# Altium footprint library PcbLib.PcbLib: 428 footprints (part 9 of 27)
Each footprint in its own frame and in the unit in brackets; x right, y up, seen from the top. Pads: shape width x height; smd on the part's side, far side on the other; paste and mask are expansions set on the pad; w line width, h text height; cw(c..) or ccw(c..) is an arc to the next point about the centre after c.
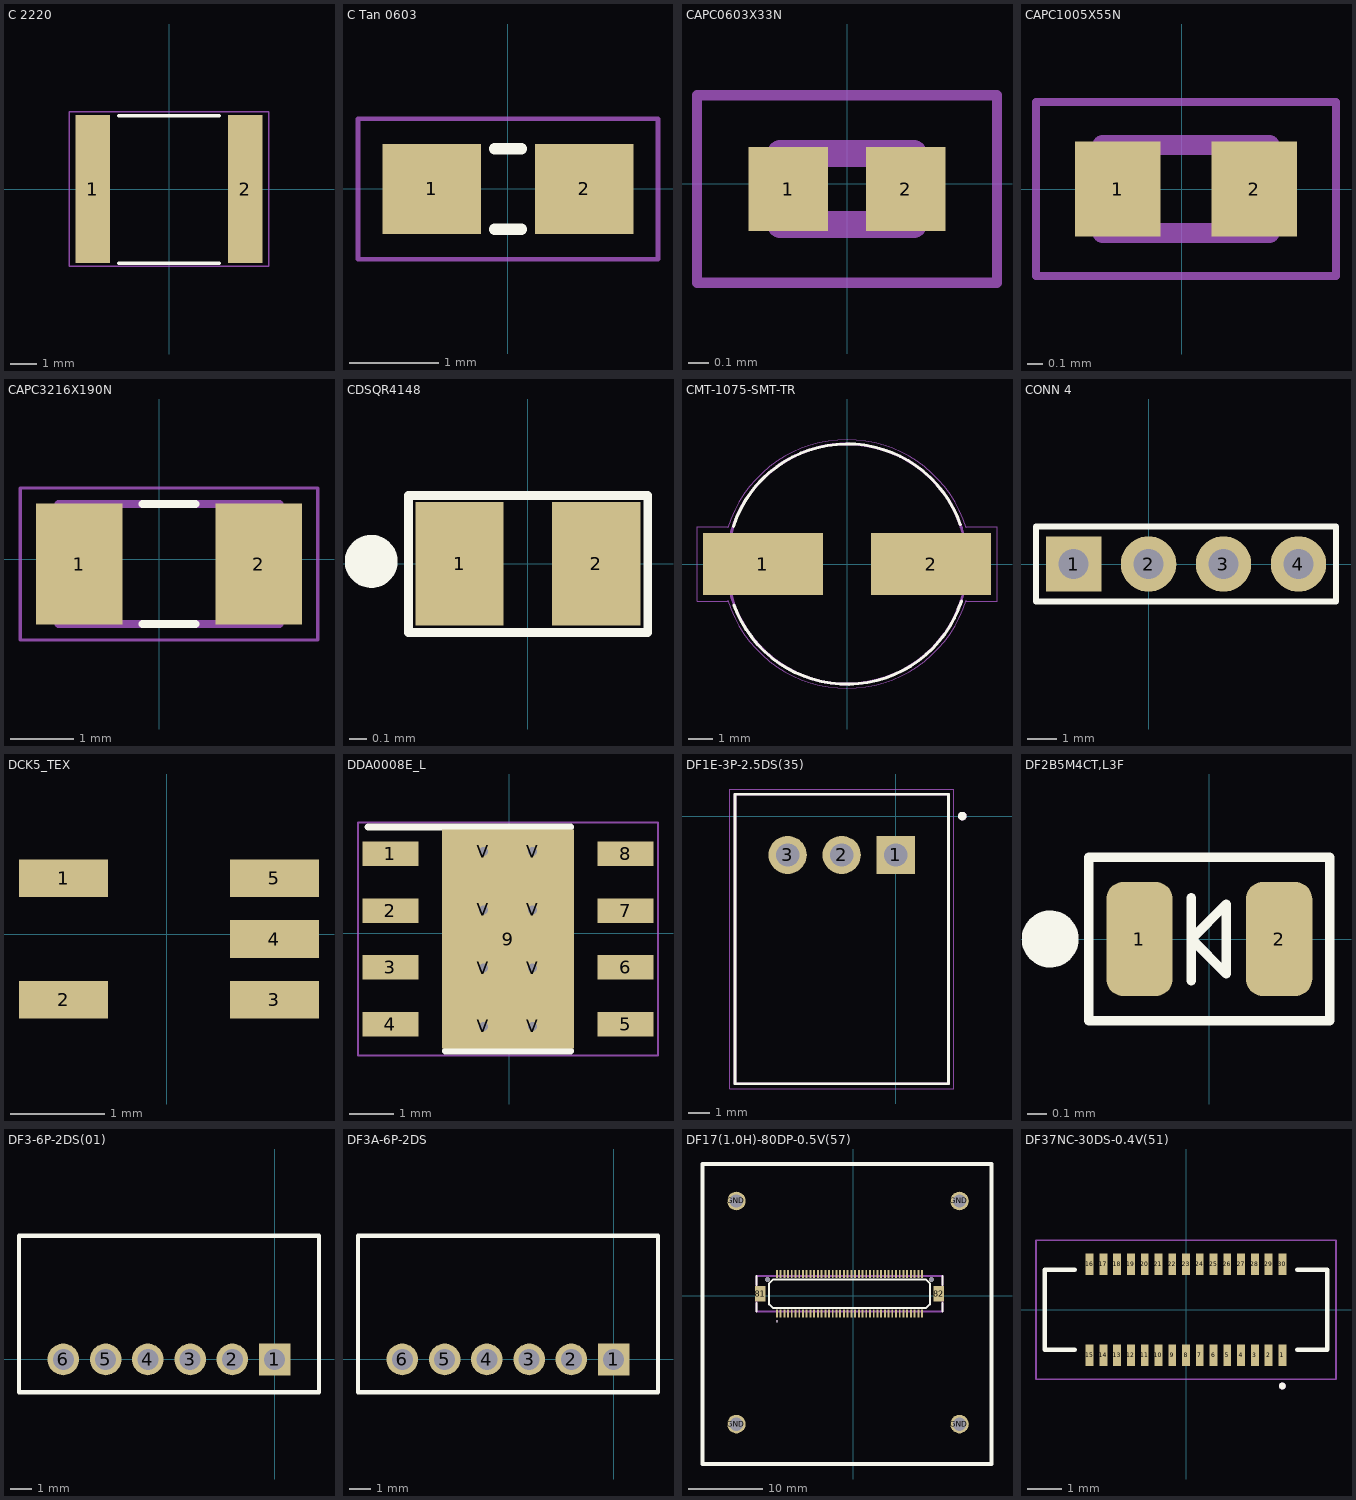
[diagram p8: the footprints below, top view; thin cyan lines are the x and y axes]

## C 2220 [mm]
height 3.1
pads (2):
  rect 1.3x5.588 smd: 1(-2.875,0) 2(2.875,0)
Top Overlay:
  lines w0.127: -1.905,-2.805 1.905,-2.805 ; -1.899,2.767 1.911,2.767
Mechanical 15:
  lines w0.05: -3.775,-2.921 3.775,-2.921 3.775,2.921 -3.775,2.921 -3.775,-2.921
3D body "CAP_C5750X7S2A226M280KB_TDK.step": height 3.1, standoff 0, extent -3.021,-2.718 3.075,2.692

## C Tan 0603 [mm]
pads (2):
  rect 1.1x1 smd: 1(-0.85,0) 2(0.85,0)
Top Overlay:
  lines w0.127: -0.15,-0.45 0.15,-0.45 ; -0.15,0.45 0.15,0.45
Mechanical 15:
  lines w0.051: -1.673,-0.783 -1.673,0.783 1.673,0.783 1.673,-0.783 -1.673,-0.783
3D body "step_temp.STEP": height 1, standoff 0, extent -0.8,-0.425 0.8,0.425

## CAPC0603X33N [mm]
pads (2):
  rect 0.38x0.4 smd paste+0 mask+0.102: 1(-0.281,-0.025) 2(0.281,-0.025)
Mechanical 13:
  lines w0.127: -0.32,-0.195 0.32,-0.195 0.32,0.145 -0.32,0.145 -0.32,-0.195
Mechanical 15:
  lines w0.05: -0.718,-0.473 0.718,-0.473 0.718,0.423 -0.718,0.423 -0.718,-0.473
3D body "step_temp.STEP": height 0.33, standoff 0, extent -0.3,-0.175 0.3,0.125

## CAPC1005X55N [mm]
pads (2):
  rect 0.54x0.6 smd: 1(-0.407,0) 2(0.457,0)
Mechanical 13:
  lines w0.127: -0.505,-0.28 0.555,-0.28 0.555,0.28 -0.505,0.28 -0.505,-0.28
Mechanical 15:
  lines w0.05: -0.925,-0.55 0.975,-0.55 0.975,0.55 -0.925,0.55 -0.925,-0.55
3D body "step_temp.STEP": height 0.55, standoff 0, extent -0.475,-0.25 0.525,0.25

## CAPC3216X190N [mm]
pads (2):
  rect 1.37x1.91 smd: 1(-1.269,-0.076) 2(1.573,-0.076)
Top Overlay:
  lines w0.127: -0.268,-1.026 0.572,-1.026 ; -0.268,0.874 0.572,0.874
Mechanical 13:
  lines w0.127: -1.598,-1.026 -1.598,0.874 1.902,0.874 1.902,-1.026 -1.598,-1.026
Mechanical 15:
  lines w0.05: -2.203,-1.281 -2.203,1.129 2.507,1.129 2.507,-1.281 -2.203,-1.281

## CDSQR4148 [mm]
pads (2):
  rect 0.5x0.7 smd: 1(-0.388,0) 2(0.388,0)
Top Overlay:
  circle w0.15: c-0.889,0.013 r0.075
  lines w0.05: -0.678,-0.39 0.68,-0.39 0.68,0.386 -0.678,0.386 -0.678,-0.39
3D body "step_temp.STEP": height 0.45, standoff 0, extent -0.5,-0.3 0.5,0.3

## CMT-1075-SMT-TR [mm]
pads (2):
  rect 5x2.6 smd: 1(-3.5,0) 2(3.5,0)
Top Overlay:
  lines w0.127: -4.737,1.561 cw(c0.005,0.02) 4.719,1.643 ; -4.706,-1.714 ccw(c0.002,0) 4.767,-1.548
Mechanical 13:
  circle w0.127: c0,0 r5
Mechanical 15:
  lines w0.05: -4.963,-1.507 ccw(c0,0.011) 4.963,-1.507 ; -4.963,1.507 cw(c0,-0.011) 4.963,1.507 ; -4.95,-1.55 -6.25,-1.55 -6.25,1.55 -4.95,1.55 ; 4.95,-1.55 6.25,-1.55 6.25,1.55 4.95,1.55
3D body "step_temp.STEP": height 3, standoff -0.1, extent -5.5,-5 5.5,5

## CONN 4 [mil]
pads (4):
  rect 74x74 hole 40: 1(-100,0)
  round 74 hole 40: 2(0,0) 3(100,0) 4(200,0)
Top Overlay:
  lines w8: -150,-50 -150,50 250,50 250,-50 -150,-50
Mechanical 13:
  region: 210,-10 190,-10 190,10 210,10
  region: 110,-10 90,-10 90,10 110,10
  region: 10,-10 -10,-10 -10,10 10,10
  region: -90,-10 -110,-10 -110,10 -90,10

## DCK5_TEX [mm]
pads (5):
  rect 0.95x0.4 smd paste+0 mask+0: 1(-1.099,0.599) 2(-1.099,-0.701) 3(1.149,-0.701) 4(1.149,-0.051) 5(1.149,0.599)
3D body "DCK5_TEX.step": height 1.09, standoff 0, extent -1.169,-1.131 1.219,1.029

## DDA0008E_L [mm]
pads (17):
  rect 1.25x0.55 smd paste+0 mask+0.051: 1(-2.65,1.778) 2(-2.65,0.508) 3(-2.65,-0.762) 4(-2.65,-2.032) 5(2.6,-2.032) 6(2.6,-0.762) 7(2.6,0.508) 8(2.6,1.778)
  rect 2.95x4.9 smd paste-2.437 mask-2.438: 9(-0.025,-0.127)
  round 0.5 hole 0.203 paste-2539.97 mask-0.241: V(-0.575,-2.077) V(-0.575,-0.777) V(-0.575,0.523) V(-0.575,1.823) V(0.525,-2.077) V(0.525,-0.777) V(0.525,0.523) V(0.525,1.823)
Top Overlay:
  lines w0.152: -3.15,2.373 1.375,2.373 ; -1.425,-2.627 1.375,-2.627
Top Paste:
  region: -1.224,-1.638 -1.225,-1.629 -1.225,1.375 -1.224,1.384 -1.222,1.393 -1.217,1.402 -1.211,1.409 -1.204,1.415 -1.196,1.419 -1.187,1.422 -1.177,1.423 1.127,1.423 1.136,1.422 1.145,1.419 1.153,1.415 1.161,1.409 1.167,1.402 1.171,1.393 1.174,1.384 1.175,1.375 1.175,-1.629 1.174,-1.638 1.171,-1.647 1.167,-1.656 1.161,-1.663 1.153,-1.669 1.145,-1.673 1.136,-1.676 1.127,-1.677 -1.177,-1.677 -1.187,-1.676 -1.196,-1.673 -1.204,-1.669 -1.211,-1.663 -1.217,-1.656 -1.222,-1.647
Top Solder:
  region: -1.224,-1.638 -1.225,-1.629 -1.225,1.375 -1.224,1.384 -1.222,1.393 -1.217,1.402 -1.211,1.409 -1.204,1.415 -1.196,1.419 -1.187,1.422 -1.177,1.423 1.127,1.423 1.136,1.422 1.145,1.419 1.153,1.415 1.161,1.409 1.167,1.402 1.171,1.393 1.174,1.384 1.175,1.375 1.175,-1.629 1.174,-1.638 1.171,-1.647 1.167,-1.656 1.161,-1.663 1.153,-1.669 1.145,-1.673 1.136,-1.676 1.127,-1.677 -1.177,-1.677 -1.187,-1.676 -1.196,-1.673 -1.204,-1.669 -1.211,-1.663 -1.217,-1.656 -1.222,-1.647
Mechanical 15:
  lines w0.05: -3.375,-2.727 3.325,-2.727 3.325,2.473 -3.375,2.473 -3.375,-2.727
  lines w0.1: -0.525,-0.127 0.475,-0.127 ; -0.025,-0.627 -0.025,0.373
3D body "TPS54335ADDAR.STEP": height 1.7, standoff 0, extent -3.025,-2.526 2.975,2.374

## DF1E-3P-2.5DS(35) [mm]
pads (3):
  rect 1.8x1.8 hole 1.1: 1(0,-1.829)
  round 1.8 hole 1.1: 2(-2.54,-1.829) 3(-5.08,-1.829)
Top Overlay:
  circle w0.2: c3.125,0 r0.1
  lines w0.127: -7.555,-12.57 2.475,-12.57 2.475,1.02 -7.555,1.02 -7.555,-12.57
Mechanical 13:
  circle w0.2: c3.125,0 r0.1
  lines w0.127: -7.555,-12.57 2.475,-12.57 ; -7.555,-12.57 2.475,-12.57 ; -7.555,-12.57 -7.555,1.02 2.475,1.02 2.475,-12.57
Mechanical 15:
  lines w0.05: -7.805,-12.82 2.725,-12.82 2.725,1.27 -7.805,1.27 -7.805,-12.82
3D body "DF1E-3S-2.5C.stp": height 9.55, standoff 1.5, extent -7.782,-16.238 2.718,-4.438
3D body "DF1E-3P-2.5DS.stp": height 8.8, standoff -2.6, extent -7.562,-12.615 2.438,1.185

## DF2B5M4CT,L3F [mm]
pads (2):
  rrect50% 0.35x0.6 smd paste-0.011 mask+0.07: 1(-0.368,0) 2(0.368,0)
Top Overlay:
  circle w0.15: c-0.838,0 r0.075
  lines w0.05: -0.094,-0.22 -0.094,0.216 ; -0.635,-0.432 0.635,-0.432 0.635,0.432 -0.635,0.432 -0.635,-0.432 ; -0.094,0 0.09,0.184 0.09,-0.184 -0.094,0
3D body "CST2-ZKN_r.stp": height 0.43, standoff 0.05, extent -0.497,-0.297 0.503,0.303

## DF3-6P-2DS(01) [mm]
pads (6):
  rect 1.5x1.5 hole 1: 1(0,0)
  round 1.5 hole 1: 2(-2,0) 3(-4,0) 4(-6,0) 5(-8,0) 6(-10,0)
Top Overlay:
  lines w0.2: -12.1,-1.55 2.1,-1.55 2.1,5.85 -12.1,5.85 -12.1,-1.55
3D body "DF3A-6P-2DS--3DModel-STEP-1.STEP": height 4.7, standoff -3.2, extent -11.95,-1.45 2.05,5.75

## DF3A-6P-2DS [mm]
pads (6):
  rect 1.5x1.5 hole 1: 1(0,0)
  round 1.5 hole 1: 2(-2,0) 3(-4,0) 4(-6,0) 5(-8,0) 6(-10,0)
Top Overlay:
  lines w0.2: -12.1,-1.55 -12.1,5.85 2.1,5.85 2.1,-1.55 -12.1,-1.55
3D body "DF3A-6P-2DS--3DModel-STEP-1.STEP": height 4.7, standoff -3.2, extent -11.95,-1.45 2.05,5.75

## DF17(1.0H)-80DP-0.5V(57) [mil]
pads (88):
  rrect100% 10x44 smd: 1(-404,-95)
  rect 10x44 smd: 2(-404,114.33) 3(-385,-95) 4(-385,114.33) 5(-365,-95) 6(-365,114.33) 7(-345,-95) 8(-345,114.33) 9(-326,-95) 10(-326,114.33) 11(-306,-95) 12(-306,114.33) 13(-286,-95) 14(-286,114.33) 15(-267,-95) 16(-267,114.33) 17(-247,-95) 18(-247,114.33) 19(-227,-95) 20(-227,114.33) 21(-208,-95) 22(-208,114.33) 23(-188,-95) 24(-188,114.33) 25(-168,-95) 26(-168,114.33) 27(-148,-95) 28(-148,114.33) 29(-129,-95) 30(-129,114.33) 31(-109,-95) 32(-109,114.33) 33(-89,-95) 34(-89,114.33) 35(-70,-95) 36(-70,114.33) 37(-50,-95) 38(-50,114.33) 39(-30,-95) 40(-30,114.33) 41(-10.16,-95) 42(-10.16,114.33) 43(9.53,-95) 44(9.53,114.33) 45(29.21,-95) 46(29.21,114.33) 47(48.9,-95) 48(48.9,114.33) 49(68.58,-95) 50(68.58,114.33) 51(88.27,-95) 52(88.27,114.33) 53(107.95,-95) 54(107.95,114.33) 55(127.64,-95) 56(127.64,114.33) 57(147.32,-95) 58(147.32,114.33) 59(167.01,-95) 60(167.01,114.33) 61(186.69,-95) 62(186.69,114.33) 63(206.38,-95) 64(206.38,114.33) 65(226.06,-95) 66(226.06,114.33) 67(245.75,-95) 68(245.75,114.33) 69(265.43,-95) 70(265.43,114.33) 71(285.12,-95) 72(285.12,114.33) 73(304.8,-95) 74(304.8,114.33) 75(324.49,-95) 76(324.49,114.33) 77(344.17,-95) 78(344.17,114.33) 79(363.86,-95) 80(363.86,114.33)
  rect 56x83 smd: 81(-493,10) 82(452.44,10)
  round 98.43 hole 70.87: GND(-619,-680) GND(-619,501) GND(562,-680) GND(562,501)
  round 26 hole 26 unplated: hole-1(413.07,84.8) hole-2(-454,84.8)
Top Overlay:
  circle w3.94: c-403.76,-135.17 r1.97
  lines w10: -513,-85 -513,-38 ; -513,57.24 -513,104.49 ; 472.13,-85 472.13,-38 ; 472.13,57.24 472.13,104.49 ; -446,-46 -426,-65 385.51,-65 405.2,-46 405.2,65.12 385.51,84.8 -426,84.8 -446,65.12 -446,-46
  lines w19.68: -798.43,-891.34 -798.43,696.85 731.5,696.85 731.5,-891.34 -798.43,-891.34
Mechanical 13:
  circle w3.94: c-403.76,-135.17 r1.97
Mechanical 16:
  lines w10: -513,-85 472.13,-85 472.13,104.49 -513,104.49 -513,-85
3D body "DF17(1_0H)-80DP-0_5V.stp": height 131.41, standoff -22.13, extent -512.13,-100 472.12,124.41
3D body "cube.STEP": height 836.22, standoff 9.45, extent -787.01,-881.5 721.65,686.22

## DF37NC-30DS-0.4V(51) [mm]
pads (30):
  rect 0.23x0.63 smd: 1(2.8,-1.325) 2(2.4,-1.325) 3(2,-1.325) 4(1.6,-1.325) 5(1.2,-1.325) 6(0.8,-1.325) 7(0.4,-1.325) 8(0,-1.325) 9(-0.4,-1.325) 10(-0.8,-1.325) 11(-1.2,-1.325) 12(-1.6,-1.325) 13(-2,-1.325) 14(-2.4,-1.325) 15(-2.8,-1.325) 16(-2.8,1.325) 17(-2.4,1.325) 18(-2,1.325) 19(-1.6,1.325) 20(-1.2,1.325) 21(-0.8,1.325) 22(-0.4,1.325) 23(0,1.325) 24(0.4,1.325) 25(0.8,1.325) 26(1.2,1.325) 27(1.6,1.325) 28(2,1.325) 29(2.4,1.325) 30(2.8,1.325)
Top Overlay:
  circle w0.1: c2.8,-2.214 r0.05
  lines w0.127: -3.235,-1.16 -4.11,-1.16 -4.11,1.16 -3.235,1.16 ; 3.235,-1.16 4.11,-1.16 4.11,1.16 3.235,1.16
Mechanical 13:
  circle w0.1: c2.8,-2.214 r0.05
Mechanical 15:
  lines w0.05: -4.36,-2.02 4.36,-2.02 4.36,2.02 -4.36,2.02 -4.36,-2.02
3D body "DF37NC-30DS-0.4V-51---3DModel-STEP-1.STEP": height 1.02, standoff 0.04, extent -4.11,-1.481 4.11,1.499